# Altium footprint library base.PcbLib: 116 footprints (part 8 of 8)
Each footprint in its own frame and in the unit in brackets; x right, y up, seen from the top. Pads: shape width x height; smd on the part's side, far side on the other; paste and mask are expansions set on the pad; w line width, h text height; cw(c..) or ccw(c..) is an arc to the next point about the centre after c.
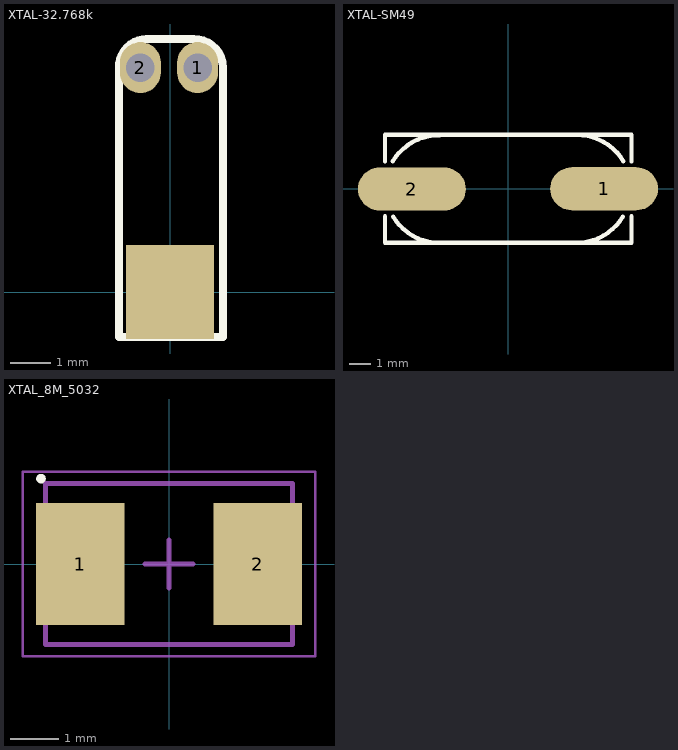
[diagram p7: the footprints below, top view; thin cyan lines are the x and y axes]

## XTAL-32.768k [mil]
pads (3):
  oval 40x50 hole 28: 1(27,220) 2(-29,220)
  rect 86x92.13 smd: ""(0,0)
Top Overlay:
  lines w8: -50,-44 52,-44 52,220 ccw(c23.5,219.5) 23,248 -23,248 ccw(c-22.5,220.5) -50,220 -50,-44
3D body "XTAL D2X6.STEP": height 78.74, standoff -39.37, extent -39.36,-76.22 39.38,226.93

## XTAL-SM49 [mm]
height 14.8
pads (2):
  oval 5x2 smd: 1(4.45,0.004) 2(-4.45,-0.004)
Top Overlay:
  lines w0.2: -5.7,-2.499 5.718,-2.499 ; -5.7,-2.496 -5.7,-1.27 ; -5.7,1.27 -5.7,2.504 5.718,2.504 5.718,1.27 ; -5.344,1.276 cw(c-3.202,-0.013) -3.175,2.487 ; -5.32,-1.287 ccw(c-3.176,-0.001) -3.176,-2.501 ; 3.175,-2.5 ccw(c3.175,0) 5.316,-1.29 ; 3.175,2.496 cw(c3.202,-0.004) 5.343,1.286 ; 5.718,-2.496 5.718,-1.27
3D body "User Library-hc49_cystal.STEP": height 4, standoff 0, extent -6.7,-2.462 6.7,2.438

## XTAL_8M_5032 [mm] "晶振贴片8M"
pads (2):
  rect 1.85x2.55 smd: 1(-1.85,0) 2(1.85,0)
Top Overlay:
  circle w0.1: c-2.667,1.778 r0.05
Mechanical 13:
  lines w0.1: -2.575,-1.675 -2.575,1.675 2.575,1.675 2.575,-1.675 -2.575,-1.675
Mechanical 15:
  lines w0.05: -3.048,-1.925 -3.048,1.925 3.048,1.925 3.048,-1.925 -3.048,-1.925
  lines w0.1: -0.5,0 0.5,0 ; 0,-0.5 0,0.5
3D body: height 1.2, standoff 0, extent -2.575,-1.675 2.575,1.675

## Z-author's ID : Nydxsst [mm] "author's teaching video :   https://www.bilibili.com/video/av49043499"